# Altium footprint library HW_HOLLAND_NCDM_MONITOR_R1.PcbLib: 472 footprints (part 25 of 30)
Each footprint in its own frame and in the unit in brackets; x right, y up, seen from the top. Pads: shape width x height; smd on the part's side, far side on the other; paste and mask are expansions set on the pad; w line width, h text height; cw(c..) or ccw(c..) is an arc to the next point about the centre after c.
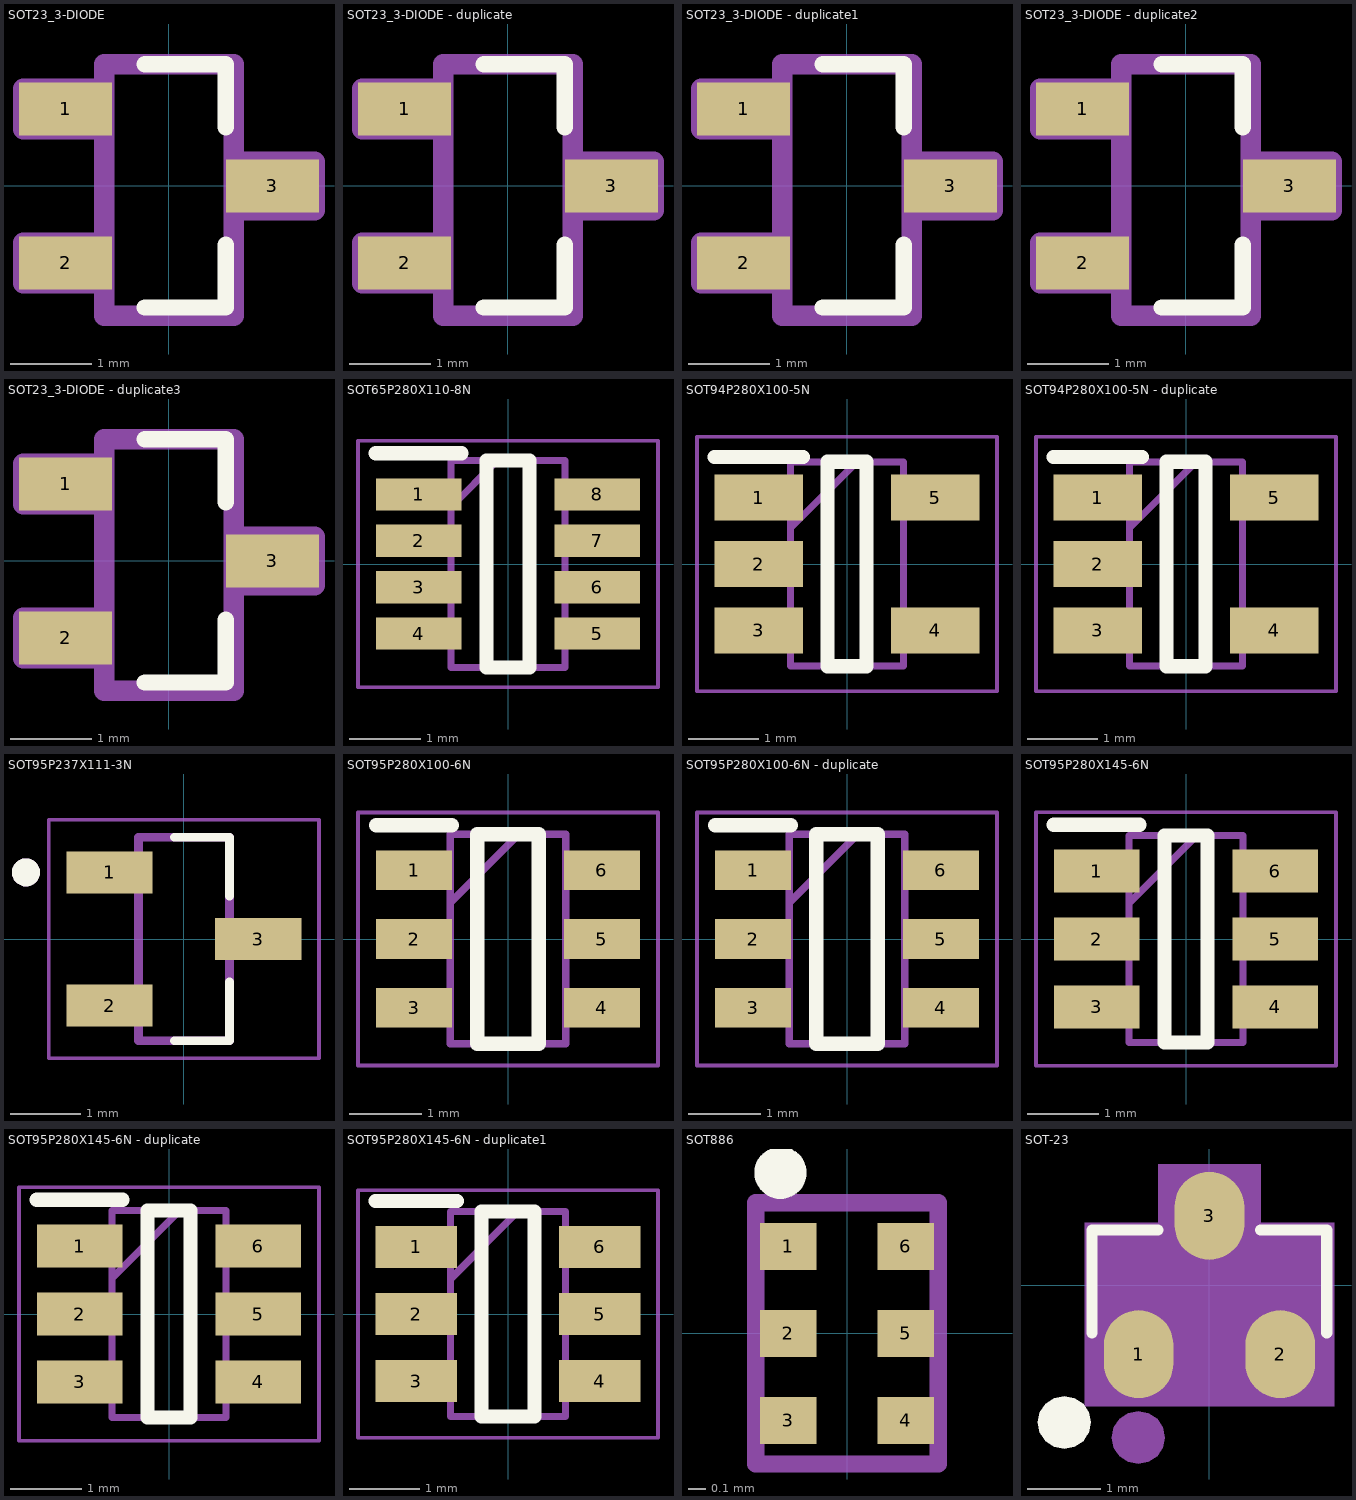
[diagram p24: the footprints below, top view; thin cyan lines are the x and y axes]

## SOT23_3-DIODE [mm]
pads (3):
  rect 1.15x0.65 smd: 1(-1.275,0.95) 2(-1.275,-0.95) 3(1.275,0)
Top Overlay:
  lines w0.2: -0.3,-1.5 0.7,-1.5 0.7,-0.725 ; -0.3,1.5 0.7,1.5 0.7,0.725
Top Designator:
  lines w0.254: -0.8,-1.2 -1.8,-1.2 -1.8,-0.7 -0.8,-0.7 ; -0.8,0.7 -1.8,0.7 -1.8,1.2 -0.8,1.2 ; 0.8,-0.3 1.8,-0.3 1.8,0.3 0.8,0.3 ; -0.8,-1.6 0.8,-1.6 0.8,1.5 -0.8,1.5 -0.8,-1.6
  text ".Designator" at -0.254,3.809 h0.76
3D body "SOT23_FMMT493TA.step": height 1.1, standoff 0, extent -1.25,-1.5 1.25,1.5

## SOT23_3-DIODE - duplicate [mm]
height 3.5
pads (3):
  rect 1.15x0.65 smd: 1(-1.275,0.95) 2(-1.275,-0.95) 3(1.275,0)
Top Overlay:
  lines w0.2: -0.3,-1.5 0.7,-1.5 0.7,-0.725 ; -0.3,1.5 0.7,1.5 0.7,0.725
Top Designator:
  lines w0.254: -0.8,-1.2 -1.8,-1.2 -1.8,-0.7 -0.8,-0.7 ; -0.8,0.7 -1.8,0.7 -1.8,1.2 -0.8,1.2 ; 0.8,-0.3 1.8,-0.3 1.8,0.3 0.8,0.3 ; -0.8,-1.6 -0.8,1.5 0.8,1.5 0.8,-1.6 -0.8,-1.6
  text ".Designator" at -0.254,3.809 h0.76
3D body "SOT23_FMMT493TA.step": height 1.1, standoff 0, extent -1.25,-1.5 1.25,1.5

## SOT23_3-DIODE - duplicate1 [mm]
pads (3):
  rect 1.15x0.65 smd: 1(-1.275,0.95) 2(-1.275,-0.95) 3(1.275,0)
Top Overlay:
  lines w0.2: -0.3,-1.5 0.7,-1.5 0.7,-0.725 ; -0.3,1.5 0.7,1.5 0.7,0.725
Top Designator:
  lines w0.254: -0.8,-1.2 -1.8,-1.2 -1.8,-0.7 -0.8,-0.7 ; -0.8,0.7 -1.8,0.7 -1.8,1.2 -0.8,1.2 ; 0.8,-0.3 1.8,-0.3 1.8,0.3 0.8,0.3 ; -0.8,-1.6 0.8,-1.6 0.8,1.5 -0.8,1.5 -0.8,-1.6
  text ".Designator" at -0.254,3.809 h0.76
3D body "SOT23_FMMT493TA.step": height 1.1, standoff 0, extent -1.25,-1.5 1.25,1.5

## SOT23_3-DIODE - duplicate2 [mm]
height 3.5
pads (3):
  rect 1.15x0.65 smd: 1(-1.275,0.95) 2(-1.275,-0.95) 3(1.275,0)
Top Overlay:
  lines w0.2: -0.3,-1.5 0.7,-1.5 0.7,-0.725 ; -0.3,1.5 0.7,1.5 0.7,0.725
Top Designator:
  lines w0.254: -0.8,-1.2 -1.8,-1.2 -1.8,-0.7 -0.8,-0.7 ; -0.8,0.7 -1.8,0.7 -1.8,1.2 -0.8,1.2 ; 0.8,-0.3 1.8,-0.3 1.8,0.3 0.8,0.3 ; -0.8,-1.6 0.8,-1.6 0.8,1.5 -0.8,1.5 -0.8,-1.6
  text ".Designator" at -0.254,3.809 h0.76
3D body "SOT23_FMMT493TA.step": height 1.1, standoff 0, extent -1.25,-1.5 1.25,1.5

## SOT23_3-DIODE - duplicate3 [mm]
height 0.52
pads (3):
  rect 1.15x0.65 smd: 1(-1.275,0.95) 2(-1.275,-0.95) 3(1.275,0)
Top Overlay:
  lines w0.2: -0.3,-1.5 0.7,-1.5 0.7,-0.725 ; -0.3,1.5 0.7,1.5 0.7,0.725
Top Designator:
  lines w0.254: -0.8,-1.2 -1.8,-1.2 -1.8,-0.7 -0.8,-0.7 ; -0.8,0.7 -1.8,0.7 -1.8,1.2 -0.8,1.2 ; 0.8,-0.3 1.8,-0.3 1.8,0.3 0.8,0.3 ; -0.8,-1.6 -0.8,1.5 0.8,1.5 0.8,-1.6 -0.8,-1.6
  text ".Designator" at -0.254,3.809 h0.76
3D body "SOT23_FMMT493TA.step": height 1.1, standoff 0, extent -1.25,-1.5 1.25,1.5

## SOT65P280X110-8N [mm]
pads (8):
  rect 1.2x0.45 smd: 1(-1.25,0.975) 2(-1.25,0.325) 3(-1.25,-0.325) 4(-1.25,-0.975) 5(1.25,-0.975) 6(1.25,-0.325) 7(1.25,0.325) 8(1.25,0.975)
Top Overlay:
  lines w0.2: -1.85,1.55 -0.65,1.55 ; -0.3,-1.45 0.3,-1.45 0.3,1.45 -0.3,1.45 -0.3,-1.45
Mechanical 13:
  lines w0.1: -0.8,0.8 -0.15,1.45 ; -0.8,-1.45 0.8,-1.45 0.8,1.45 -0.8,1.45 -0.8,-1.45
Mechanical 15:
  lines w0.05: -2.1,-1.725 2.1,-1.725 2.1,1.725 -2.1,1.725 -2.1,-1.725
3D body "INA232BIDDFR.stp": height 1.1, standoff 0, extent -1.4,-1.45 1.4,1.45

## SOT94P280X100-5N [mm]
height 0.52
pads (5):
  rect 1.25x0.65 smd: 1(-1.25,0.94) 2(-1.25,0) 3(-1.25,-0.94) 4(1.25,-0.94) 5(1.25,0.94)
Top Overlay:
  lines w0.2: -1.875,1.514 -0.625,1.514 ; -0.275,-1.448 0.275,-1.448 0.275,1.448 -0.275,1.448 -0.275,-1.448
Mechanical 13:
  lines w0.1: -0.8,0.508 0.14,1.448 ; -0.8,-1.448 0.8,-1.448 0.8,1.448 -0.8,1.448 -0.8,-1.448
Mechanical 15:
  lines w0.05: -2.125,-1.8 2.125,-1.8 2.125,1.8 -2.125,1.8 -2.125,-1.8
3D body "RT8059GJ5.stp": height 1, standoff 0, extent -1.398,-1.448 1.398,1.448

## SOT94P280X100-5N - duplicate [mm]
pads (5):
  rect 1.25x0.65 smd: 1(-1.25,0.94) 2(-1.25,0) 3(-1.25,-0.94) 4(1.25,-0.94) 5(1.25,0.94)
Top Overlay:
  lines w0.2: -1.875,1.514 -0.625,1.514 ; -0.275,-1.448 0.275,-1.448 0.275,1.448 -0.275,1.448 -0.275,-1.448
Mechanical 13:
  lines w0.1: -0.8,0.508 0.14,1.448 ; -0.8,-1.448 0.8,-1.448 0.8,1.448 -0.8,1.448 -0.8,-1.448
Mechanical 15:
  lines w0.05: -2.125,-1.8 2.125,-1.8 2.125,1.8 -2.125,1.8 -2.125,-1.8
3D body "RT8059GJ5.stp": height 1, standoff 0, extent -1.398,-1.448 1.398,1.448

## SOT95P237X111-3N [mm]
height 1.11
pads (3):
  rect 1.23x0.6 smd: 1(-1.06,0.95) 2(-1.06,-0.95) 3(1.06,0)
Top Overlay:
  circle w0.2: c-2.25,0.95 r0.1
  lines w0.127: -0.132,-1.45 0.65,-1.45 0.65,-0.613 ; -0.132,1.45 0.65,1.45 0.65,0.613
Mechanical 13:
  circle w0.2: c-2.25,0.95 r0.1
  lines w0.127: -0.65,-1.45 0.65,-1.45 0.65,1.45 -0.65,1.45 -0.65,-1.45
Mechanical 15:
  lines w0.05: -1.925,-1.7 1.925,-1.7 1.925,1.7 -1.925,1.7 -1.925,-1.7
3D body "step_temp.STEP": height 1.2, standoff 0, extent -1.2,-1.46 1.2,1.46

## SOT95P280X100-6N [mm]
pads (6):
  rect 1.05x0.55 smd: 1(-1.3,0.95) 2(-1.3,0) 3(-1.3,-0.95) 4(1.3,-0.95) 5(1.3,0) 6(1.3,0.95)
Top Overlay:
  lines w0.2: -1.825,1.575 -0.775,1.575 ; -0.425,-1.45 0.425,-1.45 0.425,1.45 -0.425,1.45 -0.425,-1.45
Mechanical 13:
  lines w0.1: -0.8,0.5 0.15,1.45 ; -0.8,-1.45 0.8,-1.45 0.8,1.45 -0.8,1.45 -0.8,-1.45
Mechanical 15:
  lines w0.05: -2.075,-1.75 2.075,-1.75 2.075,1.75 -2.075,1.75 -2.075,-1.75
3D body "AP22615AWU-7.stp": height 1, standoff 0, extent -1.4,-1.45 1.4,1.45

## SOT95P280X100-6N - duplicate [mm]
pads (6):
  rect 1.05x0.55 smd: 1(-1.3,0.95) 2(-1.3,0) 3(-1.3,-0.95) 4(1.3,-0.95) 5(1.3,0) 6(1.3,0.95)
Top Overlay:
  lines w0.2: -1.825,1.575 -0.775,1.575 ; -0.425,-1.45 0.425,-1.45 0.425,1.45 -0.425,1.45 -0.425,-1.45
Mechanical 13:
  lines w0.1: -0.8,0.5 0.15,1.45 ; -0.8,-1.45 0.8,-1.45 0.8,1.45 -0.8,1.45 -0.8,-1.45
Mechanical 15:
  lines w0.05: -2.075,-1.75 2.075,-1.75 2.075,1.75 -2.075,1.75 -2.075,-1.75
3D body "AP22615AWU-7.stp": height 1, standoff 0, extent -1.4,-1.45 1.4,1.45

## SOT95P280X145-6N [mm]
pads (6):
  rect 1.2x0.6 smd: 1(-1.25,0.95) 2(-1.25,0) 3(-1.25,-0.95) 4(1.25,-0.95) 5(1.25,0) 6(1.25,0.95)
Top Overlay:
  lines w0.2: -1.85,1.6 -0.65,1.6 ; -0.3,-1.45 -0.3,1.45 0.3,1.45 0.3,-1.45 -0.3,-1.45
Mechanical 13:
  lines w0.05: -2.1,-1.775 -2.1,1.775 2.1,1.775 2.1,-1.775 -2.1,-1.775
  lines w0.1: -0.8,0.5 0.15,1.45 ; -0.8,-1.45 -0.8,1.45 0.8,1.45 0.8,-1.45 -0.8,-1.45
3D body "sot-23-6.stp": height 1.13, standoff 0.01, extent -1.472,-1.46 1.372,1.461

## SOT95P280X145-6N - duplicate [mm]
pads (6):
  rect 1.2x0.6 smd: 1(-1.25,0.95) 2(-1.25,0) 3(-1.25,-0.95) 4(1.25,-0.95) 5(1.25,0) 6(1.25,0.95)
Top Overlay:
  lines w0.2: -1.85,1.6 -0.65,1.6 ; -0.3,-1.45 0.3,-1.45 0.3,1.45 -0.3,1.45 -0.3,-1.45
Mechanical 13:
  lines w0.05: -2.1,-1.775 2.1,-1.775 2.1,1.775 -2.1,1.775 -2.1,-1.775
  lines w0.1: -0.8,0.5 0.15,1.45 ; -0.8,-1.45 0.8,-1.45 0.8,1.45 -0.8,1.45 -0.8,-1.45
3D body "sot-23-6.stp": height 1.13, standoff 0.01, extent -1.472,-1.46 1.372,1.461

## SOT95P280X145-6N - duplicate1 [mm]
height 0.52
pads (6):
  rect 1.15x0.6 smd: 1(-1.3,0.95) 2(-1.3,0) 3(-1.3,-0.95) 4(1.3,-0.95) 5(1.3,0) 6(1.3,0.95)
Top Overlay:
  lines w0.2: -1.875,1.6 -0.725,1.6 ; -0.375,-1.45 0.375,-1.45 0.375,1.45 -0.375,1.45 -0.375,-1.45
Mechanical 13:
  lines w0.1: -0.812,0.5 0.138,1.45 ; -0.812,-1.45 0.812,-1.45 0.812,1.45 -0.812,1.45 -0.812,-1.45
Mechanical 15:
  lines w0.05: -2.125,-1.75 2.125,-1.75 2.125,1.75 -2.125,1.75 -2.125,-1.75
3D body "SRV05-4HTG-D.stp": height 1.45, standoff 0, extent -1.4,-1.45 1.4,1.45

## SOT886 [mm]
pads (6):
  rect 0.325x0.27 smd: 1(-0.338,0.5) 2(-0.338,0) 3(-0.338,-0.5) 4(0.337,-0.5) 5(0.337,0) 6(0.337,0.5)
Top Overlay:
  circle w0.2: c-0.381,0.922 r0.05
Top Designator:
  lines w0.1: -0.525,-0.75 0.525,-0.75 0.525,0.75 -0.525,0.75 -0.525,-0.75
  text ".Designator" at -0.167,2.499 h0.5
3D body "SOT886.step": height 0.5, standoff 0, extent -0.523,-0.748 0.523,0.748

## SOT-23 [mm]
pads (3):
  oval 0.95x1.2 smd: 1(-0.966,-0.943) 2(0.966,-0.943) 3(0,0.943)
Top Overlay:
  dashed: -1.978,-1.514 -2.116,-1.541 -2.233,-1.619 -2.312,-1.736 -2.339,-1.874 -2.312,-2.012 -2.285,-2.051 -2.233,-2.129 -2.116,-2.207 -1.978,-2.235 -1.84,-2.207 -1.723,-2.129 -1.671,-2.051 -1.645,-2.012 -1.618,-1.874 -1.645,-1.736 -1.723,-1.619 -1.84,-1.541
  lines w0.152: -1.6,-0.65 -1.6,0.75 -0.7,0.75 ; 0.7,0.75 1.6,0.75 1.6,-0.65
  text ".Designator" at 0.635,0.211 h0.64
Top Assembly:
  dashed: -0.97,-1.719 -1.108,-1.747 -1.225,-1.825 -1.303,-1.942 -1.331,-2.08 -1.303,-2.218 -1.277,-2.257 -1.225,-2.335 -1.108,-2.413 -0.97,-2.441 -0.832,-2.413 -0.715,-2.335 -0.663,-2.257 -0.637,-2.218 -0.609,-2.08 -0.637,-1.942 -0.715,-1.825 -0.832,-1.747
  lines w0.025: -1.55,-0.65 -1.55,0.75 -0.3,0.75 -0.3,1.425 0.3,1.425 0.3,0.75 1.55,0.75 1.55,-0.65 1.25,-0.65 1.25,-1.325 -1.25,-1.325 -1.25,-0.65 -1.55,-0.65
Top 3D Body:
  region: -0.7,1.65 0.7,1.65 0.7,0.85 1.7,0.85 1.7,-1.65 -1.7,-1.65 -1.7,0.85 -0.7,0.85
Mechanical 17:
  text "1" at -0.966,-2.568 h4.06
  text "3" at 0,-0.682 h4.06
  text "2" at 0.966,-2.568 h4.06
3D body: height 3.81, standoff 0, extent -1.7,-1.65 1.7,1.65